# Altium footprint library Custom1.PcbLib: 554 footprints (part 10 of 35)
Each footprint in its own frame and in the unit in brackets; x right, y up, seen from the top. Pads: shape width x height; smd on the part's side, far side on the other; paste and mask are expansions set on the pad; w line width, h text height; cw(c..) or ccw(c..) is an arc to the next point about the centre after c.
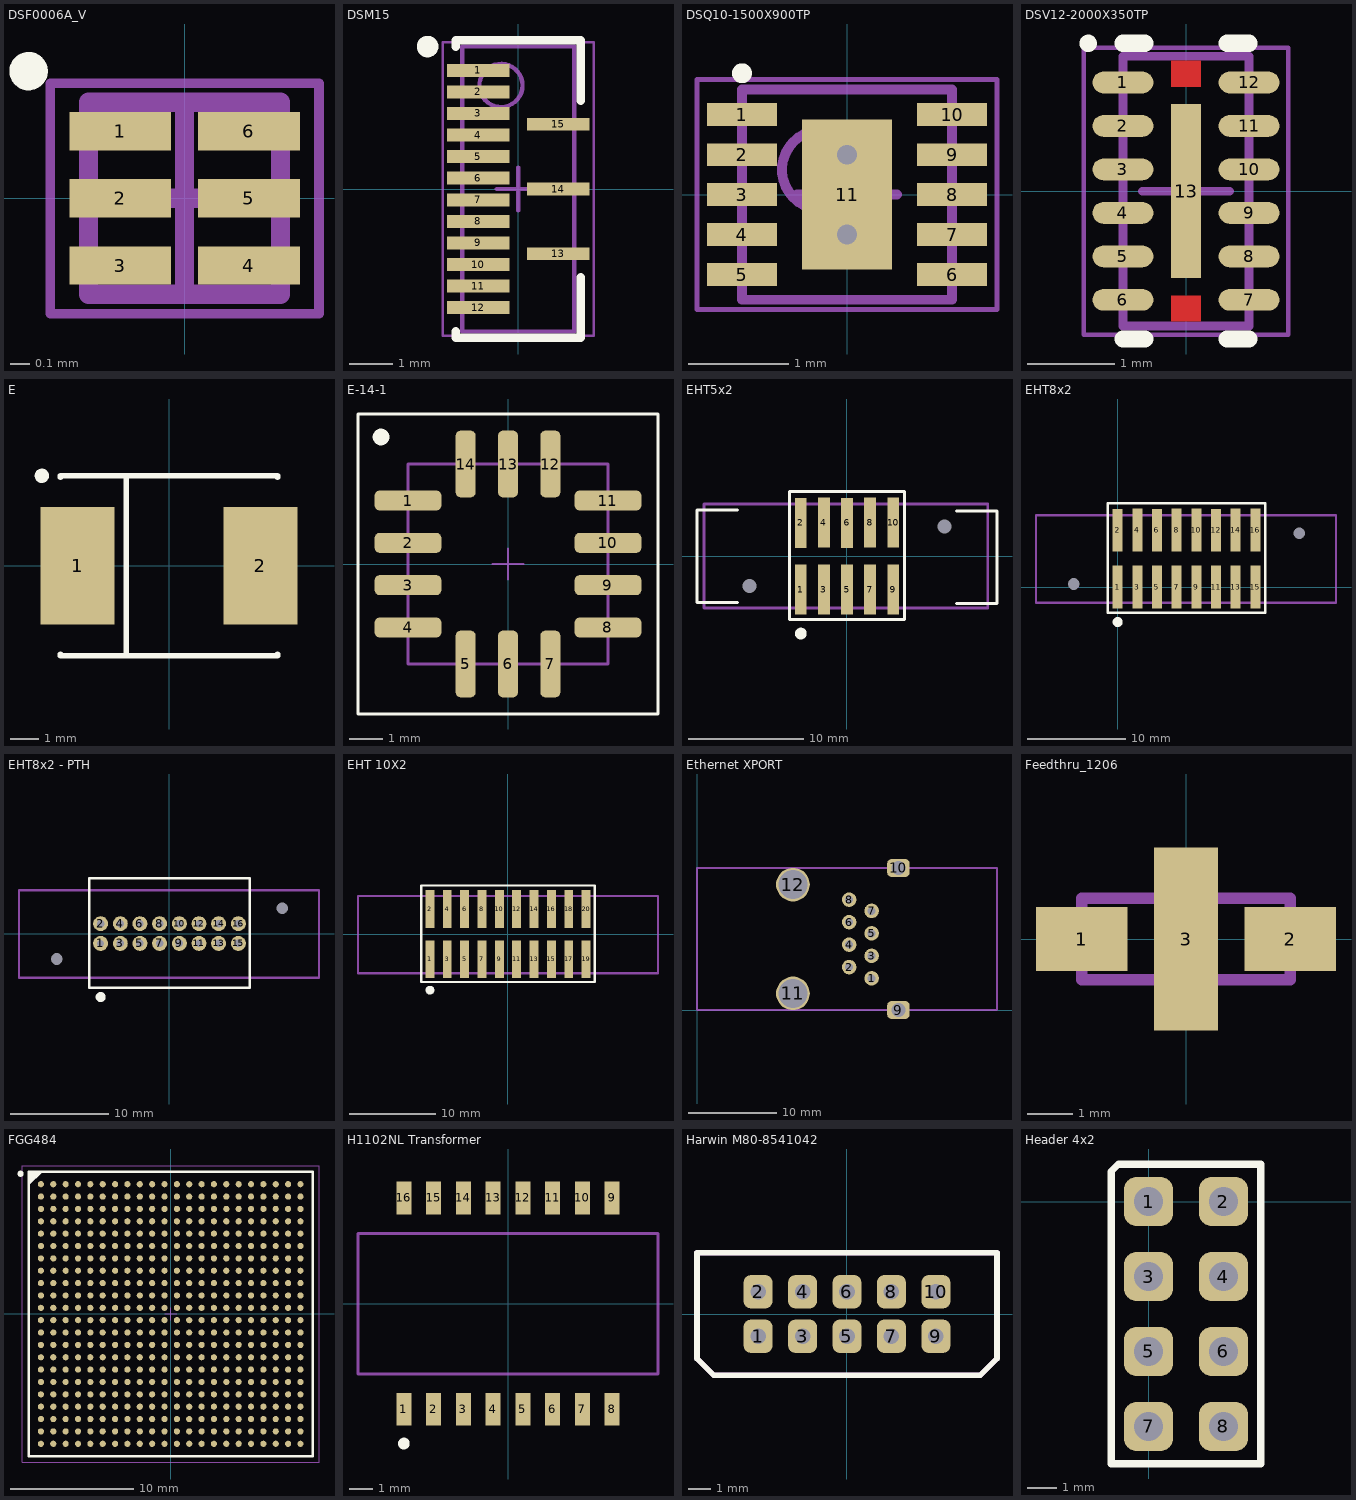
[diagram p9: the footprints below, top view; thin cyan lines are the x and y axes]

## DSF0006A_V [mm] "SON, 6-Leads, Body 1x1mm, Pitch 0.35mm, TI Recommend"
height 0.4
pads (6):
  rect 0.53x0.2 smd paste-0.5: 1(-0.335,0.35) 2(-0.335,0) 3(-0.335,-0.35) 4(0.335,-0.35) 5(0.335,0) 6(0.335,0.35)
Top Overlay:
  circle w0.1: c-0.812,0.662 r0.05
Top Paste:
  rectangle: -0.6,0.268 -0.07,0.433
  rectangle: -0.6,-0.082 -0.07,0.083
  rectangle: -0.6,-0.433 -0.07,-0.267
  region: 0.6,-0.267 0.07,-0.267 0.07,-0.433 0.6,-0.433
  region: 0.6,0.083 0.07,0.083 0.07,-0.082 0.6,-0.082
  region: 0.6,0.433 0.07,0.433 0.07,0.268 0.6,0.268
Mechanical 13:
  lines w0.1: -0.5,-0.5 0.5,-0.5 0.5,0.5 -0.5,0.5 -0.5,-0.5
Mechanical 15:
  lines w0.05: -0.7,-0.6 0.7,-0.6 0.7,0.6 -0.7,0.6 -0.7,-0.6
  lines w0.1: -0.5,0 0.5,0 ; 0,-0.5 0,0.5
3D body: height 0.4, standoff 0, extent -0.5,-0.5 0.5,0.5

## DSM15 [mm] "SON, 15-Leads, Body 2.5x6.5mm, Pitch 0.5mm, TI Recommended"
height 0.8
pads (15):
  rect 1.45x0.3 smd paste-0.025 mask+0.06: 1(-0.925,2.75) 2(-0.925,2.25) 3(-0.925,1.75) 4(-0.925,1.25) 5(-0.925,0.75) 6(-0.925,0.25) 7(-0.925,-0.25) 8(-0.925,-0.75) 9(-0.925,-1.25) 10(-0.925,-1.75) 11(-0.925,-2.25) 12(-0.925,-2.75) 13(0.925,-1.5) 14(0.925,0) 15(0.925,1.5)
Top Overlay:
  circle w0.25: c-2.1,3.3 r0.125
  circle w0.25: c-2.1,3.3 r0.125
  lines w0.2: -1.45,-3.3 -1.45,-3.45 1.45,-3.45 1.45,-2.05 ; -1.45,3.3 -1.45,3.45 1.45,3.45 1.45,2.05
Mechanical 13:
  circle w0.1: c-0.4,2.4 r0.5
  lines w0.1: -1.3,-3.3 -1.3,3.3 1.3,3.3 1.3,-3.3 -1.3,-3.3
Mechanical 15:
  lines w0.05: -1.75,-3.4 -1.75,3.4 1.75,3.4 1.75,-3.4 -1.75,-3.4
  lines w0.1: -0.5,0 0.5,0 ; 0,-0.5 0,0.5
3D body: height 0.8, standoff 0, extent -1.3,-3.3 1.3,3.3

## DSQ10-1500X900TP [mm] "SON, 10-Leads, Body 2x2mm, Pitch 0.4mm, Thermal Pad 1.5x0.9mm, TI Recommended"
height 0.8
pads (11):
  rect 0.7x0.23 smd paste-0.115 mask+0.05: 1(-1.05,0.8) 2(-1.05,0.4) 3(-1.05,0) 4(-1.05,-0.4) 5(-1.05,-0.8) 6(1.05,-0.8) 7(1.05,-0.4) 8(1.05,0) 9(1.05,0.4) 10(1.05,0.8)
  rect 0.9x1.5 smd paste-0.45 mask+0.05: 11(0,0)
via 0,-0.4 diameter 0.5 hole 0.2
via 0,0.4 diameter 0.5 hole 0.2
Top Overlay:
  circle w0.1: c-1.05,1.215 r0.05
Top Paste:
  rectangle: -0.35,-0.6 0.35,0.6
  rectangle: -1.375,0.3 -0.725,0.5
  rectangle: -1.375,0.7 -0.725,0.9
  rectangle: -1.375,-0.1 -0.725,0.1
  rectangle: -1.375,-0.5 -0.725,-0.3
  rectangle: -1.375,-0.9 -0.725,-0.7
  rectangle: 0.725,-0.9 1.375,-0.7
  rectangle: 0.725,-0.5 1.375,-0.3
  rectangle: 0.725,-0.1 1.375,0.1
  rectangle: 0.725,0.3 1.375,0.5
  rectangle: 0.725,0.7 1.375,0.9
Mechanical 13:
  circle w0.1: c-0.25,0.25 r0.4
  lines w0.1: -1.05,-1.05 1.05,-1.05 1.05,1.05 -1.05,1.05 -1.05,-1.05
Mechanical 15:
  lines w0.05: -1.5,-1.15 1.5,-1.15 1.5,1.15 -1.5,1.15 -1.5,-1.15
  lines w0.1: -0.5,0 0.5,0 ; 0,-0.5 0,0.5
3D body: height 0.8, standoff 0, extent -1.05,-1.05 1.05,1.05

## DSV12-2000X350TP [mm] "SON, 12-Leads, Body 1.35x3mm, Pitch 0.5mm, Thermal Pad 2x0.35mm, TI Recommended"
height 0.8
pads (13):
  oval 0.7x0.25 smd paste+0 mask+0.07: 1(-0.725,1.25) 2(-0.725,0.75) 3(-0.725,0.25) 4(-0.725,-0.25) 5(-0.725,-0.75) 6(-0.725,-1.25) 7(0.725,-1.25) 8(0.725,-0.75) 9(0.725,-0.25) 10(0.725,0.25) 11(0.725,0.75) 12(0.725,1.25)
  rect 0.35x2 smd paste-0.175 mask+0.07: 13(0,0)
Top Layer:
  rectangle: -0.175,1.2 0.175,1.5
  region: 0.175,-1.2 -0.175,-1.2 -0.175,-1.5 0.175,-1.5
Top Overlay:
  circle w0.1: c-1.125,1.7 r0.05
  lines w0.2: -0.725,-1.7 -0.475,-1.7 ; -0.725,1.7 -0.475,1.7 ; 0.475,-1.7 0.725,-1.7 ; 0.475,1.7 0.725,1.7
Top Paste:
  region: 0.15,-0.15 -0.15,-0.15 -0.15,-0.95 0.15,-0.95
  rectangle: -0.15,0.15 0.15,0.95
Mechanical 13:
  lines w0.1: -0.725,-1.55 0.725,-1.55 0.725,1.55 -0.725,1.55 -0.725,-1.55
Mechanical 15:
  lines w0.05: -1.175,-1.65 1.175,-1.65 1.175,1.65 -1.175,1.65 -1.175,-1.65
  lines w0.1: -0.5,0 0.5,0 ; 0,-0.5 0,0.5
3D body: height 0.8, standoff 0, extent -0.725,-1.55 0.725,1.55

## E [mm] "Capacitor, SM Tantalum; Body 7.3 x 6.0 mm (LxW typ)"
height 3.8
pads (2):
  rect 2.6x4.1 smd: 1(-3.2,0) 2(3.2,0)
Top Overlay:
  circle w0.25: c-4.45,3.15 r0.125
  lines w0.2: -3.8,-3.1 -3.8,-3.15 3.8,-3.15 3.8,-3.1 ; -3.8,3.1 -3.8,3.15 3.8,3.15 3.8,3.1 ; -1.5,-3.15 -1.5,3.15

## E-14-1 [mm] "14-CLCC (6x6)"
pads (14):
  rrect50% 2x0.6 smd: 1(-3,1.905) 2(-3,0.635) 3(-3,-0.635) 4(-3,-1.905) 8(3,-1.905) 9(3,-0.635) 10(3,0.635) 11(3,1.905)
  rrect50% 0.6x2 smd: 5(-1.27,-3) 6(0,-3) 7(1.27,-3) 12(1.27,3) 13(0,3) 14(-1.27,3)
Top Overlay:
  circle w0.25: c-3.81,3.81 r0.125
  lines w0.1: -4.5,-4.5 -4.5,4.5 4.5,4.5 4.5,-4.5 -4.5,-4.5
Mechanical 13:
  lines w0.1: -3,-3 -3,3 3,3 3,-3 -3,-3
Mechanical 15:
  lines w0.05: -0.475,0 0.475,0 ; 0,-0.475 0,0.475 ; -4.5,-4.5 -4.5,4.5 4.5,4.5 4.5,-4.5 -4.5,-4.5
3D body: height 2.2, standoff 1, extent -2.99,-2.98 2.99,3

## EHT5x2 [mm]
pads (12):
  round 0 hole 1.19 unplated: 0(-8.45,-2.59) 0(8.45,2.566)
  rect 1.02x4.34 smd: 1(-4,-2.9) 2(-4,2.876) 3(-2,-2.9) 4(-2,2.9) 5(0,-2.9) 6(0,2.876) 7(2,-2.9) 8(2,2.9) 9(4,-2.9) 10(4,2.9)
Top Overlay:
  circle w0.508: c-4,-6.71 r0.254
  lines w0.254: -9.5,-4 -13,-4 -13,4 -9.5,4 ; 9.5,-4.1 13,-4.1 13,3.9 9.5,3.9 ; -5,-5.5 5,-5.5 5,5.6 -5,5.6 -5,-5.5
Mechanical 15:
  lines w0.254: -12.4,-4.5 12.2,-4.5 12.2,4.5 -12.4,4.5 -12.4,-4.5
3D body "Samtec-EHT-105-01-L-D-SM-LC.STEP": height 12.59, standoff -1.13, extent -12.217,-4.492 12.203,4.398

## EHT8x2 [mm]
pads (18):
  round 0 hole 1.19 unplated: 0(-4.45,0.31) 0(18.45,5.466)
  rect 1.02x4.34 smd: 1(0,0) 2(0,5.776) 3(2,0) 4(2,5.8) 5(4,0) 6(4,5.776) 7(6,0) 8(6,5.8) 9(8,0) 10(8,5.8) 11(10,0) 12(10,5.776) 13(12,0) 14(12,5.8) 15(14,0) 16(14,5.8)
Top Overlay:
  circle w0.508: c0,-3.556 r0.254
  lines w0.254: -1,-2.6 15,-2.6 15,8.5 -1,8.5 -1,-2.6
Mechanical 15:
  lines w0.254: -8.3,-1.6 -8.3,7.3 22.2,7.3 22.2,-1.6 -8.3,-1.6
3D body "Samtec-EHT-108-01-L-D-SM-LC.STEP": height 12.59, standoff -1.13, extent -8.217,-1.632 22.203,7.258

## EHT8x2 - PTH [mil]
pads (18):
  round 0 hole 46.85 unplated: 0(-450.79,-101.97) 0(450.79,101.02)
  round 60 hole 27.56: 1(-275.59,-39.37)
  round 60 hole 30: 2(-275.59,39.37) 3(-196.85,-39.37) 4(-196.85,39.37) 5(-118.11,-39.37) 6(-118.11,39.37) 7(-39.37,-39.37) 8(-39.37,39.37) 9(39.37,-39.37) 10(39.37,39.37) 11(118.11,-39.37) 12(118.11,39.37) 13(196.85,-39.37) 14(196.85,39.37) 15(275.59,-39.37) 16(275.59,39.37)
Top Overlay:
  circle w20: c-275.59,-254.17 r10
  lines w10: -322,-216.54 322,-216.54 322,220.47 -322,220.47 -322,-216.54
Mechanical 15:
  lines w10: -602.36,-177.17 -602.36,173.23 598.43,173.23 598.43,-177.17 -602.36,-177.17
3D body "Samtec-EHT-108-01-L-D-SM-LC.STEP": height 495.5, standoff -44.5, extent -599.09,-178.42 598.55,171.58

## EHT 10X2 [mm]
pads (20):
  rect 1.02x4.34 smd: 1(-9,-2.9) 2(-9,2.9) 3(-7,-2.9) 4(-7,2.9) 5(-5,-2.9) 6(-5,2.9) 7(-3,-2.9) 8(-3,2.9) 9(-1,-2.9) 10(-1,2.9) 11(1,-2.9) 12(1,2.9) 13(3,-2.9) 14(3,2.9) 15(5,-2.9) 16(5,2.9) 17(7,-2.9) 18(7,2.9) 19(9,-2.9) 20(9,2.9)
Top Overlay:
  circle w0.508: c-9,-6.456 r0.254
  lines w0.254: -10,-5.5 10,-5.5 10,5.6 -10,5.6 -10,-5.5
Mechanical 15:
  lines w0.254: -17.3,-4.5 -17.3,4.4 17.3,4.4 17.3,-4.5 -17.3,-4.5
3D body: height 0.25, standoff 0, extent -12.4,1.7 -12.4,1.7
3D body "EHT-110-01-S-D-SM.stp": height 12.33, standoff 0.01, extent -17.192,-4.345 17.193,4.545

## Ethernet XPORT [mil]
pads (12):
  round 65 hole 35: 1(777,141) 2(677,191) 3(777,241) 4(677,291) 5(777,341) 6(677,391) 7(777,441) 8(677,491)
  rrect50% 100x80 hole 63: 9(896,0) 10(896,632)
  round 150 hole 128: 11(427,74) 12(427,558)
Mechanical 15:
  lines w10: 0,0 0,632 1335,632 1335,0 0,0
3D body "Xport 04 housing.STEP": height 582.71, standoff -127.95, extent 2,-56.35 1334.67,686

## Feedthru_1206 [mm]
pads (3):
  rect 2x1.4 smd paste-2: 1(-2.286,0) 2(2.286,0)
  rect 1.4x4 smd paste-1.4: 3(0,0)
Top Paste:
  rectangle: -0.508,0.508 0.508,1.524
  rectangle: -0.508,-1.524 0.508,-0.508
  rectangle: 1.27,-0.635 2.286,0.635
  rectangle: -2.286,-0.635 -1.27,0.635
Mechanical 15:
  lines w0.254: -2.286,-0.889 -2.286,0.889 2.286,0.889 2.286,-0.889 -2.286,-0.889
3D body: height 1.3, standoff 0, extent -2.286,-0.508 2.286,0.508

## FGG484 [mm] "BGA, 484-Balls, Body 23x23mm, Pitch 1mm"
height 2.6
pads (484):
  round 0.5 smd: A1(-10.5,10.5) A2(-9.5,10.5) A3(-8.5,10.5) A4(-7.5,10.5) A5(-6.5,10.5) A6(-5.5,10.5) A7(-4.5,10.5) A8(-3.5,10.5) A9(-2.5,10.5) A10(-1.5,10.5) A11(-0.5,10.5) A12(0.5,10.5) A13(1.5,10.5) A14(2.5,10.5) A15(3.5,10.5) A16(4.5,10.5) A17(5.5,10.5) A18(6.5,10.5) A19(7.5,10.5) A20(8.5,10.5) A21(9.5,10.5) A22(10.5,10.5) AA1(-10.5,-9.5) AA2(-9.5,-9.5) AA3(-8.5,-9.5) AA4(-7.5,-9.5) AA5(-6.5,-9.5) AA6(-5.5,-9.5) AA7(-4.5,-9.5) AA8(-3.5,-9.5) AA9(-2.5,-9.5) AA10(-1.5,-9.5) AA11(-0.5,-9.5) AA12(0.5,-9.5) AA13(1.5,-9.5) AA14(2.5,-9.5) AA15(3.5,-9.5) AA16(4.5,-9.5) AA17(5.5,-9.5) AA18(6.5,-9.5) AA19(7.5,-9.5) AA20(8.5,-9.5) AA21(9.5,-9.5) AA22(10.5,-9.5) AB1(-10.5,-10.5) AB2(-9.5,-10.5) AB3(-8.5,-10.5) AB4(-7.5,-10.5) AB5(-6.5,-10.5) AB6(-5.5,-10.5) AB7(-4.5,-10.5) AB8(-3.5,-10.5) AB9(-2.5,-10.5) AB10(-1.5,-10.5) AB11(-0.5,-10.5) AB12(0.5,-10.5) AB13(1.5,-10.5) AB14(2.5,-10.5) AB15(3.5,-10.5) AB16(4.5,-10.5) AB17(5.5,-10.5) AB18(6.5,-10.5) AB19(7.5,-10.5) AB20(8.5,-10.5) AB21(9.5,-10.5) AB22(10.5,-10.5) B1(-10.5,9.5) B2(-9.5,9.5) B3(-8.5,9.5) B4(-7.5,9.5) B5(-6.5,9.5) B6(-5.5,9.5) B7(-4.5,9.5) B8(-3.5,9.5) B9(-2.5,9.5) B10(-1.5,9.5) B11(-0.5,9.5) B12(0.5,9.5) B13(1.5,9.5) B14(2.5,9.5) B15(3.5,9.5) B16(4.5,9.5) B17(5.5,9.5) B18(6.5,9.5) B19(7.5,9.5) B20(8.5,9.5) B21(9.5,9.5) B22(10.5,9.5) C1(-10.5,8.5) C2(-9.5,8.5) C3(-8.5,8.5) C4(-7.5,8.5) C5(-6.5,8.5) C6(-5.5,8.5) C7(-4.5,8.5) C8(-3.5,8.5) C9(-2.5,8.5) C10(-1.5,8.5) C11(-0.5,8.5) C12(0.5,8.5) C13(1.5,8.5) C14(2.5,8.5) C15(3.5,8.5) C16(4.5,8.5) C17(5.5,8.5) C18(6.5,8.5) C19(7.5,8.5) C20(8.5,8.5) C21(9.5,8.5) C22(10.5,8.5) D1(-10.5,7.5) D2(-9.5,7.5) D3(-8.5,7.5) D4(-7.5,7.5) D5(-6.5,7.5) D6(-5.5,7.5) D7(-4.5,7.5) D8(-3.5,7.5) D9(-2.5,7.5) D10(-1.5,7.5) D11(-0.5,7.5) D12(0.5,7.5) D13(1.5,7.5) D14(2.5,7.5) D15(3.5,7.5) D16(4.5,7.5) D17(5.5,7.5) D18(6.5,7.5) D19(7.5,7.5) D20(8.5,7.5) D21(9.5,7.5) D22(10.5,7.5) E1(-10.5,6.5) E2(-9.5,6.5) E3(-8.5,6.5) E4(-7.5,6.5) E5(-6.5,6.5) E6(-5.5,6.5) E7(-4.5,6.5) E8(-3.5,6.5) E9(-2.5,6.5) E10(-1.5,6.5) E11(-0.5,6.5) E12(0.5,6.5) E13(1.5,6.5) E14(2.5,6.5) E15(3.5,6.5) E16(4.5,6.5) E17(5.5,6.5) E18(6.5,6.5) E19(7.5,6.5) E20(8.5,6.5) E21(9.5,6.5) E22(10.5,6.5) F1(-10.5,5.5) F2(-9.5,5.5) F3(-8.5,5.5) F4(-7.5,5.5) F5(-6.5,5.5) F6(-5.5,5.5) F7(-4.5,5.5) F8(-3.5,5.5) F9(-2.5,5.5) F10(-1.5,5.5) F11(-0.5,5.5) F12(0.5,5.5) F13(1.5,5.5) F14(2.5,5.5) F15(3.5,5.5) F16(4.5,5.5) F17(5.5,5.5) F18(6.5,5.5) F19(7.5,5.5) F20(8.5,5.5) F21(9.5,5.5) F22(10.5,5.5) G1(-10.5,4.5) G2(-9.5,4.5) G3(-8.5,4.5) G4(-7.5,4.5) G5(-6.5,4.5) G6(-5.5,4.5) G7(-4.5,4.5) G8(-3.5,4.5) G9(-2.5,4.5) G10(-1.5,4.5) G11(-0.5,4.5) G12(0.5,4.5) G13(1.5,4.5) G14(2.5,4.5) G15(3.5,4.5) G16(4.5,4.5) G17(5.5,4.5) G18(6.5,4.5) G19(7.5,4.5) G20(8.5,4.5) G21(9.5,4.5) G22(10.5,4.5) H1(-10.5,3.5) H2(-9.5,3.5) H3(-8.5,3.5) H4(-7.5,3.5) H5(-6.5,3.5) H6(-5.5,3.5) H7(-4.5,3.5) H8(-3.5,3.5) H9(-2.5,3.5) H10(-1.5,3.5) H11(-0.5,3.5) H12(0.5,3.5) H13(1.5,3.5) H14(2.5,3.5) H15(3.5,3.5) H16(4.5,3.5) H17(5.5,3.5) H18(6.5,3.5) H19(7.5,3.5) H20(8.5,3.5) H21(9.5,3.5) H22(10.5,3.5) J1(-10.5,2.5) J2(-9.5,2.5) J3(-8.5,2.5) J4(-7.5,2.5) J5(-6.5,2.5) J6(-5.5,2.5) J7(-4.5,2.5) J8(-3.5,2.5) J9(-2.5,2.5) J10(-1.5,2.5) J11(-0.5,2.5) J12(0.5,2.5) J13(1.5,2.5) J14(2.5,2.5) J15(3.5,2.5) J16(4.5,2.5) J17(5.5,2.5) J18(6.5,2.5) J19(7.5,2.5) J20(8.5,2.5) J21(9.5,2.5) J22(10.5,2.5) K1(-10.5,1.5) K2(-9.5,1.5) K3(-8.5,1.5) K4(-7.5,1.5) K5(-6.5,1.5) K6(-5.5,1.5) K7(-4.5,1.5) K8(-3.5,1.5) K9(-2.5,1.5) K10(-1.5,1.5) K11(-0.5,1.5) K12(0.5,1.5) K13(1.5,1.5) K14(2.5,1.5) K15(3.5,1.5) K16(4.5,1.5) K17(5.5,1.5) K18(6.5,1.5) K19(7.5,1.5) K20(8.5,1.5) K21(9.5,1.5) K22(10.5,1.5) L1(-10.5,0.5) L2(-9.5,0.5) L3(-8.5,0.5) L4(-7.5,0.5) L5(-6.5,0.5) L6(-5.5,0.5) L7(-4.5,0.5) L8(-3.5,0.5) L9(-2.5,0.5) L10(-1.5,0.5) L11(-0.5,0.5) L12(0.5,0.5) L13(1.5,0.5) L14(2.5,0.5) L15(3.5,0.5) L16(4.5,0.5) L17(5.5,0.5) L18(6.5,0.5) L19(7.5,0.5) L20(8.5,0.5) L21(9.5,0.5) L22(10.5,0.5) M1(-10.5,-0.5) M2(-9.5,-0.5) M3(-8.5,-0.5) M4(-7.5,-0.5) M5(-6.5,-0.5) M6(-5.5,-0.5) M7(-4.5,-0.5) M8(-3.5,-0.5) M9(-2.5,-0.5) M10(-1.5,-0.5) M11(-0.5,-0.5) M12(0.5,-0.5) M13(1.5,-0.5) M14(2.5,-0.5) M15(3.5,-0.5) M16(4.5,-0.5) M17(5.5,-0.5) M18(6.5,-0.5) M19(7.5,-0.5) M20(8.5,-0.5) M21(9.5,-0.5) M22(10.5,-0.5) N1(-10.5,-1.5) N2(-9.5,-1.5) N3(-8.5,-1.5) N4(-7.5,-1.5) N5(-6.5,-1.5) N6(-5.5,-1.5) N7(-4.5,-1.5) N8(-3.5,-1.5) N9(-2.5,-1.5) N10(-1.5,-1.5) N11(-0.5,-1.5) N12(0.5,-1.5) N13(1.5,-1.5) N14(2.5,-1.5) N15(3.5,-1.5) N16(4.5,-1.5) N17(5.5,-1.5) N18(6.5,-1.5) N19(7.5,-1.5) N20(8.5,-1.5) N21(9.5,-1.5) N22(10.5,-1.5) P1(-10.5,-2.5) P2(-9.5,-2.5) P3(-8.5,-2.5) P4(-7.5,-2.5) P5(-6.5,-2.5) P6(-5.5,-2.5) P7(-4.5,-2.5) P8(-3.5,-2.5) P9(-2.5,-2.5) P10(-1.5,-2.5) P11(-0.5,-2.5) P12(0.5,-2.5) P13(1.5,-2.5) P14(2.5,-2.5) P15(3.5,-2.5) P16(4.5,-2.5) P17(5.5,-2.5) P18(6.5,-2.5) P19(7.5,-2.5) P20(8.5,-2.5) P21(9.5,-2.5) P22(10.5,-2.5) R1(-10.5,-3.5) R2(-9.5,-3.5) R3(-8.5,-3.5) R4(-7.5,-3.5) R5(-6.5,-3.5) R6(-5.5,-3.5) R7(-4.5,-3.5) R8(-3.5,-3.5) R9(-2.5,-3.5) R10(-1.5,-3.5) R11(-0.5,-3.5) R12(0.5,-3.5) R13(1.5,-3.5) R14(2.5,-3.5) R15(3.5,-3.5) R16(4.5,-3.5) R17(5.5,-3.5) R18(6.5,-3.5) R19(7.5,-3.5) R20(8.5,-3.5) R21(9.5,-3.5) R22(10.5,-3.5) T1(-10.5,-4.5) T2(-9.5,-4.5) T3(-8.5,-4.5) T4(-7.5,-4.5) T5(-6.5,-4.5) T6(-5.5,-4.5) T7(-4.5,-4.5) T8(-3.5,-4.5) T9(-2.5,-4.5) T10(-1.5,-4.5) T11(-0.5,-4.5) T12(0.5,-4.5) T13(1.5,-4.5) T14(2.5,-4.5) T15(3.5,-4.5) T16(4.5,-4.5) T17(5.5,-4.5) T18(6.5,-4.5) T19(7.5,-4.5) T20(8.5,-4.5) T21(9.5,-4.5) T22(10.5,-4.5) U1(-10.5,-5.5) U2(-9.5,-5.5) U3(-8.5,-5.5) U4(-7.5,-5.5) U5(-6.5,-5.5) U6(-5.5,-5.5) U7(-4.5,-5.5) U8(-3.5,-5.5) U9(-2.5,-5.5) U10(-1.5,-5.5) U11(-0.5,-5.5) U12(0.5,-5.5) U13(1.5,-5.5) U14(2.5,-5.5) U15(3.5,-5.5) U16(4.5,-5.5) U17(5.5,-5.5) U18(6.5,-5.5) U19(7.5,-5.5) U20(8.5,-5.5) U21(9.5,-5.5) U22(10.5,-5.5) V1(-10.5,-6.5) V2(-9.5,-6.5) V3(-8.5,-6.5) V4(-7.5,-6.5) V5(-6.5,-6.5) V6(-5.5,-6.5) V7(-4.5,-6.5) V8(-3.5,-6.5) V9(-2.5,-6.5) V10(-1.5,-6.5) V11(-0.5,-6.5) V12(0.5,-6.5) V13(1.5,-6.5) V14(2.5,-6.5) V15(3.5,-6.5) V16(4.5,-6.5) V17(5.5,-6.5) V18(6.5,-6.5) V19(7.5,-6.5) V20(8.5,-6.5) V21(9.5,-6.5) V22(10.5,-6.5) W1(-10.5,-7.5) W2(-9.5,-7.5) W3(-8.5,-7.5) W4(-7.5,-7.5) W5(-6.5,-7.5) W6(-5.5,-7.5) W7(-4.5,-7.5) W8(-3.5,-7.5) W9(-2.5,-7.5) W10(-1.5,-7.5) W11(-0.5,-7.5) W12(0.5,-7.5) W13(1.5,-7.5) W14(2.5,-7.5) W15(3.5,-7.5) W16(4.5,-7.5) W17(5.5,-7.5) W18(6.5,-7.5) W19(7.5,-7.5) W20(8.5,-7.5) W21(9.5,-7.5) W22(10.5,-7.5) Y1(-10.5,-8.5) Y2(-9.5,-8.5) Y3(-8.5,-8.5) Y4(-7.5,-8.5) Y5(-6.5,-8.5) Y6(-5.5,-8.5) Y7(-4.5,-8.5) Y8(-3.5,-8.5) Y9(-2.5,-8.5) Y10(-1.5,-8.5) Y11(-0.5,-8.5) Y12(0.5,-8.5) Y13(1.5,-8.5) Y14(2.5,-8.5) Y15(3.5,-8.5) Y16(4.5,-8.5) Y17(5.5,-8.5) Y18(6.5,-8.5) Y19(7.5,-8.5) Y20(8.5,-8.5) Y21(9.5,-8.5) Y22(10.5,-8.5)
Top Overlay:
  circle w0.25: c-12.15,11.35 r0.125
  region: -10.5,11.5 -11.5,10.5 -11.5,11.5
  lines w0.2: -11.5,10.5 -10.5,11.5 ; -11.5,-11.5 -11.5,11.5 11.5,11.5 11.5,-11.5 -11.5,-11.5
Mechanical 13:
  lines w0.1: -11.5,-11.5 -11.5,11.5 11.5,11.5 11.5,-11.5 -11.5,-11.5
Mechanical 15:
  lines w0.05: -12,-12 -12,12 12,12 12,-12 -12,-12
  lines w0.1: -0.5,0 0.5,0 ; 0,-0.5 0,0.5
3D body: height 2.6, standoff 0.35, extent -11.5,-11.5 11.5,11.5

## H1102NL Transformer [mm]
height 1
pads (16):
  rect 0.64x1.4 smd: 1(-4.445,-4.51) 2(-3.175,-4.51) 3(-1.905,-4.51) 4(-0.635,-4.51) 5(0.635,-4.51) 6(1.905,-4.51) 7(3.175,-4.51) 8(4.445,-4.51) 9(4.445,4.51) 10(3.175,4.51) 11(1.905,4.51) 12(0.635,4.51) 13(-0.635,4.51) 14(-1.905,4.51) 15(-3.175,4.51) 16(-4.445,4.51)
Top Overlay:
  circle w0.25: c-4.443,-5.969 r0.125
Mechanical 13:
  lines w0.127: -6.4,-3 -6.4,3 6.4,3 6.4,-3 -6.4,-3
3D body: height 6, standoff 0, extent -6.4,-3 6.4,3

## Harwin M80-8541042 [mm]
pads (10):
  rrect50% 1.3x1.5 hole 0.7: 1(-4,-1) 2(-4,1) 3(-2,-1) 4(-2,1) 5(0,-1) 6(0,1) 7(2,-1) 8(2,1) 9(4,-1) 10(4,1)
Top Overlay:
  lines w0.254: -6.75,-2 -6.75,2.75 6.75,2.75 6.75,-2 6,-2.75 -6,-2.75 -6.75,-2
Mechanical 1:
  lines w0.254: -6.75,-2 -6.75,2.75 6.75,2.75 6.75,-2 6,-2.75 -6,-2.75 -6.75,-2

## Header 4x2 [mil]
pads (8):
  rrect50% 65x65 hole 39: 1(0,0) 2(100,0) 3(0,-100) 4(100,-100) 5(0,-200) 6(100,-200) 7(0,-300) 8(100,-300)
Top Overlay:
  lines w10: -50,-350 -50,40 -40,50 150,50 150,-350 -50,-350
3D body "901310124.stp": height 364.65, standoff -113.69, extent -50,-350 150,50